# Altium footprint library connectors.PcbLib: 256 footprints (part 9 of 16)
Each footprint in its own frame and in the unit in brackets; x right, y up, seen from the top. Pads: shape width x height; smd on the part's side, far side on the other; paste and mask are expansions set on the pad; w line width, h text height; cw(c..) or ccw(c..) is an arc to the next point about the centre after c.
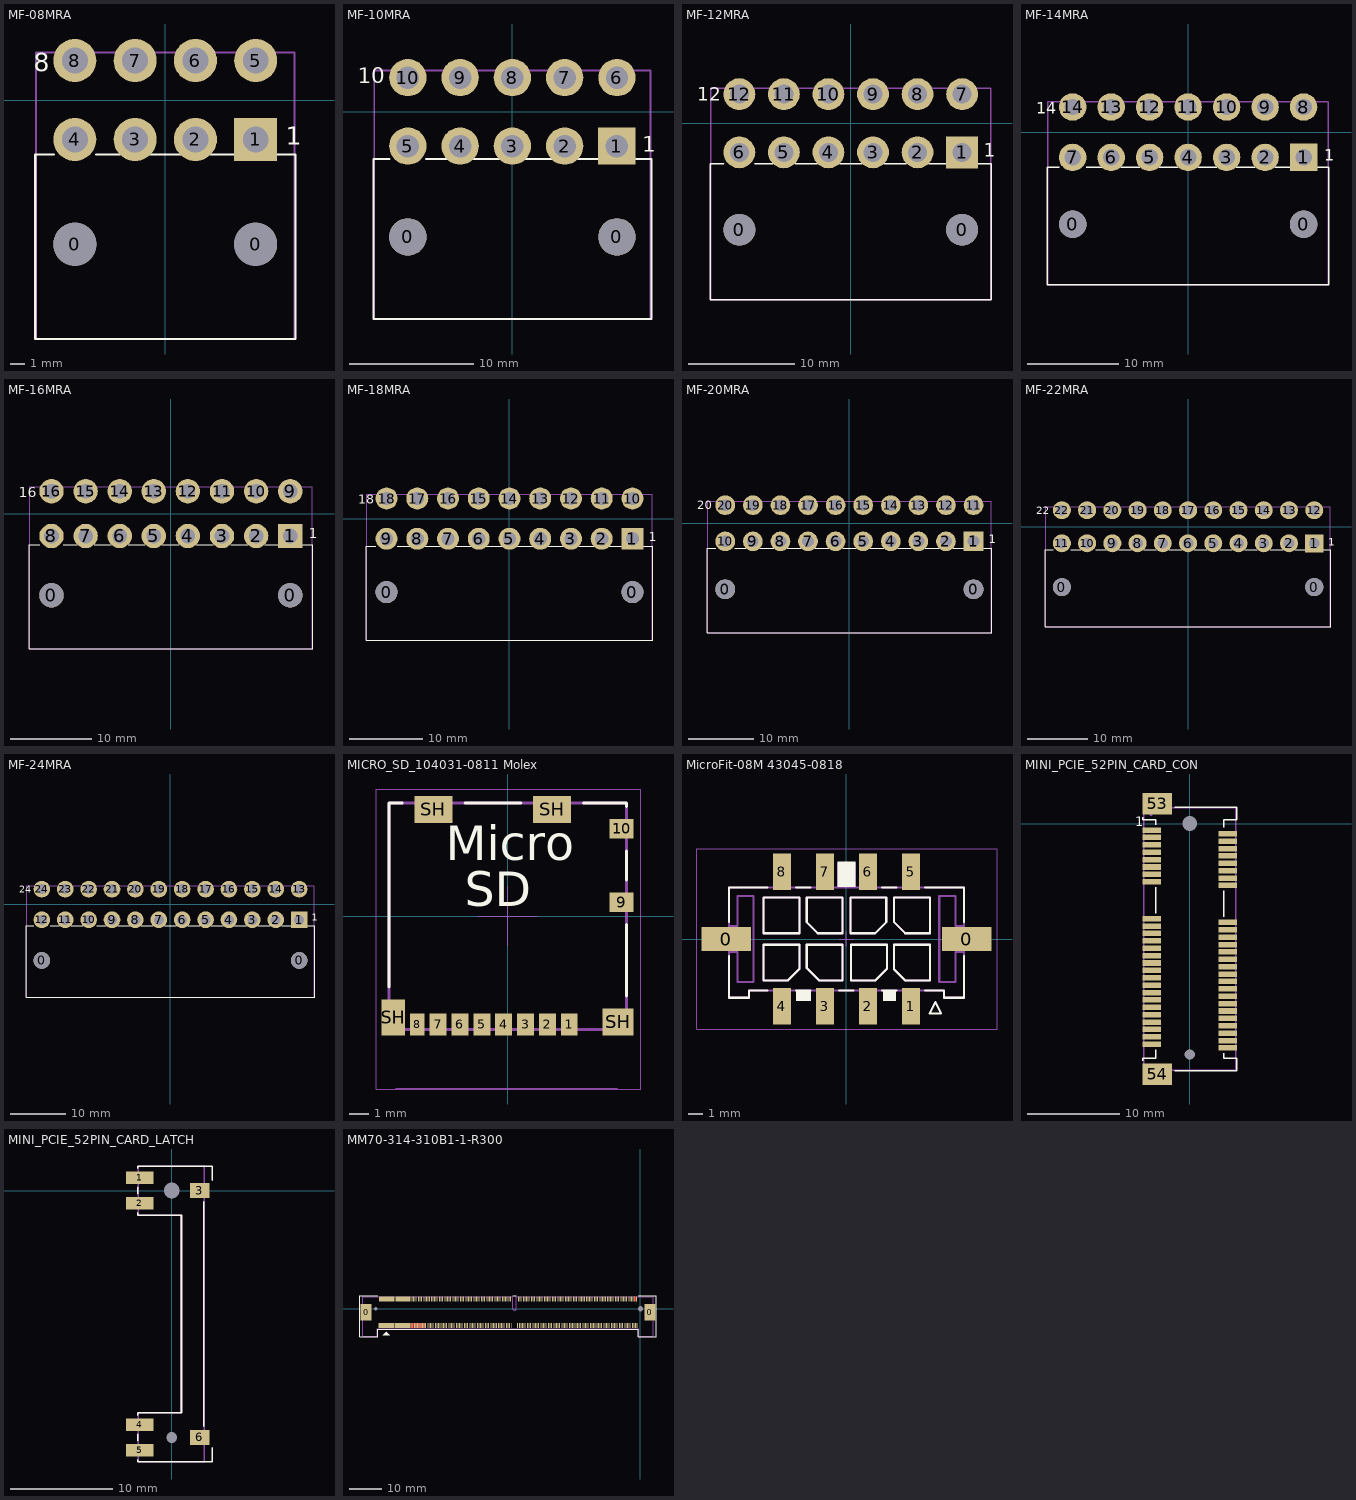
[diagram p8: the footprints below, top view; thin cyan lines are the x and y axes]

## MF-08MRA [mm] "Dual row Right angle header 08p"
height 10
pads (10):
  round 3 hole 3 unplated: 0(-6.3,-10.05) 0(6.3,-10.05)
  rect 3x3 hole 1.8: 1(6.3,-2.75)
  round 3 hole 1.8: 2(2.1,-2.75) 3(-2.1,-2.75) 4(-6.3,-2.75) 5(6.3,2.75) 6(2.1,2.75) 7(-2.1,2.75) 8(-6.3,2.75)
Top Overlay:
  lines w0.15: -9.063,-4.5 -9.063,-16.65 ; -7.77,-3.8 -9.063,-3.8 -9.063,-16.65 ; -4.83,-3.8 -3.15,-3.8 ; -1.05,-3.8 1.05,-3.8 ; 3.15,-3.8 5.25,-3.8 ; 7.35,-3.8 9.063,-3.8 9.063,-16.65 ; 9.063,-4.5 9.063,-16.65 ; -9.063,-16.65 9.063,-16.65 ; -9.063,-16.65 9.063,-16.65
  text "1" at 8.4,-3.125 h1.27
  text "8" at -9.15,2 h1.27
TopAssy 13:
  lines w0.15: -9,-16.65 -9,3.32 9,3.32 9,-16.65 -9,-16.65
3D body "64900829522.stp": height 11.36, standoff -3.59, extent -9,-16.65 9,3.32

## MF-10MRA [mm] "Dual row Right angle header 10p"
height 10
pads (12):
  round 3 hole 3 unplated: 0(-8.4,-10.05) 0(8.4,-10.05)
  rect 3x3 hole 1.8: 1(8.385,-2.75)
  round 3 hole 1.8: 2(4.2,-2.75) 3(0,-2.75) 4(-4.2,-2.75) 5(-8.4,-2.75) 6(8.4,2.75) 7(4.2,2.75) 8(0,2.75) 9(-4.2,2.75) 10(-8.4,2.75)
Top Overlay:
  lines w0.15: -11.163,-4.5 -11.163,-16.65 ; -9.87,-3.8 -11.163,-3.8 -11.163,-16.65 ; -6.93,-3.8 -5.25,-3.8 ; -3.15,-3.8 -1.05,-3.8 ; 1.05,-3.8 3.15,-3.8 ; 5.25,-3.8 7.35,-3.8 ; 9.45,-3.8 11.163,-3.8 11.163,-16.65 ; 11.163,-4.5 11.163,-16.65 ; -11.163,-16.65 11.163,-16.65 ; -11.163,-16.65 11.163,-16.65
  text "10" at -12.4,2.3 h1.27
  text "1" at 10.425,-3.2 h1.27
TopAssy 13:
  lines w0.15: -11.1,-16.65 -11.1,3.32 11.1,3.32 11.1,-16.65 -11.1,-16.65
3D body "64901029522.stp": height 11.36, standoff -3.59, extent -11.1,-16.65 11.1,3.32

## MF-12MRA [mm] "Dual row Right angle header 12p"
height 10
pads (14):
  round 3 hole 3 unplated: 0(-10.5,-10.05) 0(10.5,-10.05)
  rect 3x3 hole 1.8: 1(10.5,-2.75)
  round 3 hole 1.8: 2(6.3,-2.75) 3(2.1,-2.75) 4(-2.1,-2.75) 5(-6.3,-2.75) 6(-10.5,-2.75) 7(10.5,2.75) 8(6.3,2.75) 9(2.1,2.75) 10(-2.1,2.75) 11(-6.3,2.75) 12(-10.5,2.75)
Top Overlay:
  lines w0.15: -13.262,-4.5 -13.262,-16.65 ; -11.97,-3.8 -13.263,-3.8 -13.262,-16.65 ; -9.03,-3.8 -7.35,-3.8 ; -5.25,-3.8 -3.15,-3.8 ; -1.05,-3.8 1.05,-3.8 ; 3.15,-3.8 5.25,-3.8 ; 7.35,-3.8 9.45,-3.8 ; 11.565,-3.8 13.263,-3.8 13.263,-16.65 ; 13.263,-4.5 13.263,-16.65 ; -13.262,-16.65 13.263,-16.65 ; -13.262,-16.65 13.263,-16.65
  text "1" at 12.525,-3.15 h1.27
  text "12" at -14.5,2.1 h1.27
TopAssy 13:
  lines w0.15: -13.2,-16.65 13.2,-16.65 13.2,3.32 -13.2,3.32 -13.2,-16.65
3D body "64901229522.stp": height 11.36, standoff -3.59, extent -13.2,-16.65 13.2,3.32

## MF-14MRA [mm] "Dual row Right angle header 14p"
height 10
pads (16):
  round 3 hole 3 unplated: 0(-12.6,-10.05) 0(12.6,-10.05)
  rect 3x3 hole 1.8: 1(12.6,-2.75)
  round 3 hole 1.8: 2(8.4,-2.75) 3(4.2,-2.75) 4(0,-2.75) 5(-4.2,-2.75) 6(-8.4,-2.75) 7(-12.6,-2.75) 8(12.6,2.75) 9(8.4,2.75) 10(4.2,2.75) 11(0,2.75) 12(-4.2,2.75) 13(-8.4,2.75) 14(-12.6,2.75)
Top Overlay:
  lines w0.15: -15.363,-4.5 -15.363,-16.65 ; -14.07,-3.8 -15.363,-3.8 -15.363,-16.65 ; -11.13,-3.8 -9.45,-3.8 ; -7.35,-3.8 -5.25,-3.8 ; -3.15,-3.8 -1.05,-3.8 ; 1.05,-3.8 3.15,-3.8 ; 5.25,-3.8 7.35,-3.8 ; 9.45,-3.8 11.55,-3.8 ; 13.665,-3.8 15.363,-3.8 15.363,-16.65 ; 15.363,-4.5 15.363,-16.65 ; -15.363,-16.65 15.363,-16.65 ; -15.363,-16.65 15.363,-16.65
  text "1" at 14.875,-3.1 h1.27
  text "14" at -16.6,2 h1.27
TopAssy 13:
  lines w0.15: -15.3,-16.65 -15.3,3.32 15.3,3.32 15.3,-16.65 -15.3,-16.65
3D body "64901429522.stp": height 11.36, standoff -3.59, extent -15.3,-16.65 15.3,3.32

## MF-16MRA [mm] "Dual row Right angle header 16p"
height 10
pads (18):
  round 3 hole 3 unplated: 0(-14.7,-10.05) 0(14.7,-10.05)
  rect 3x3 hole 1.8: 1(14.7,-2.75)
  round 3 hole 1.8: 2(10.5,-2.75) 3(6.3,-2.75) 4(2.1,-2.75) 5(-2.1,-2.75) 6(-6.3,-2.75) 7(-10.5,-2.75) 8(-14.7,-2.75) 9(14.7,2.75) 10(10.5,2.75) 11(6.3,2.75) 12(2.1,2.75) 13(-2.1,2.75) 14(-6.3,2.75) 15(-10.5,2.75) 16(-14.7,2.75)
Top Overlay:
  lines w0.15: -17.462,-4.5 -17.462,-16.65 ; -16.17,-3.8 -17.463,-3.8 -17.462,-16.65 ; -13.23,-3.8 -11.55,-3.8 ; -9.45,-3.8 -7.35,-3.8 ; -5.25,-3.8 -3.15,-3.8 ; -1.05,-3.8 1.05,-3.8 ; 3.15,-3.8 5.25,-3.8 ; 7.35,-3.8 9.45,-3.8 ; 11.55,-3.8 13.65,-3.8 ; 15.765,-3.8 17.463,-3.8 17.463,-16.65 ; 17.463,-4.5 17.463,-16.65 ; -17.462,-16.65 17.463,-16.65 ; -17.462,-16.65 17.463,-16.65
  text "1" at 16.975,-3.05 h1.27
  text "16" at -18.7,2 h1.27
TopAssy 13:
  lines w0.15: -17.4,-16.65 17.4,-16.65 17.4,3.32 -17.4,3.32 -17.4,-16.65
3D body "64901629522.stp": height 11.36, standoff -3.59, extent -17.4,-16.65 17.4,3.32

## MF-18MRA [mm] "Dual row Right angle header 18p"
height 10
pads (20):
  round 3 hole 3 unplated: 0(-16.8,-10.05) 0(16.8,-10.05)
  rect 3x3 hole 1.8: 1(16.8,-2.75)
  round 3 hole 1.8: 2(12.6,-2.75) 3(8.4,-2.75) 4(4.2,-2.75) 5(0,-2.75) 6(-4.2,-2.75) 7(-8.4,-2.75) 8(-12.6,-2.75) 9(-16.8,-2.75) 10(16.8,2.75) 11(12.6,2.75) 12(8.4,2.75) 13(4.2,2.75) 14(0,2.75) 15(-4.2,2.75) 16(-8.4,2.75) 17(-12.6,2.75) 18(-16.8,2.75)
Top Overlay:
  lines w0.15: -19.562,-4.5 -19.562,-16.65 ; -18.27,-3.8 -19.563,-3.8 -19.562,-16.65 ; -15.33,-3.8 -13.65,-3.8 ; -11.55,-3.8 -9.45,-3.8 ; -7.35,-3.8 -5.25,-3.8 ; -3.15,-3.8 -1.05,-3.8 ; 1.05,-3.8 3.15,-3.8 ; 5.25,-3.8 7.35,-3.8 ; 9.45,-3.8 11.55,-3.8 ; 13.65,-3.8 15.75,-3.8 ; 17.865,-3.8 19.563,-3.8 19.563,-16.65 ; 19.563,-4.5 19.563,-16.65 ; -19.562,-16.65 19.563,-16.65 ; -19.562,-16.65 19.563,-16.65
  text "18" at -20.7,2 h1.27
  text "1" at 19.025,-3.075 h1.27
TopAssy 13:
  lines w0.15: -19.5,-16.65 -19.5,3.32 19.5,3.32 19.5,-16.65 -19.5,-16.65
3D body "64901829522.stp": height 11.36, standoff -3.59, extent -19.5,-16.65 19.5,3.32

## MF-20MRA [mm] "Dual row Right angle header 20p"
height 10
pads (22):
  round 3 hole 3 unplated: 0(-18.9,-10.05) 0(18.9,-10.05)
  rect 3x3 hole 1.8: 1(18.9,-2.75)
  round 3 hole 1.8: 2(14.7,-2.75) 3(10.5,-2.75) 4(6.3,-2.75) 5(2.1,-2.75) 6(-2.1,-2.75) 7(-6.3,-2.75) 8(-10.5,-2.75) 9(-14.7,-2.75) 10(-18.9,-2.75) 11(18.9,2.75) 12(14.7,2.75) 13(10.5,2.75) 14(6.3,2.75) 15(2.1,2.75) 16(-2.1,2.75) 17(-6.3,2.75) 18(-10.5,2.75) 19(-14.7,2.75) 20(-18.9,2.75)
Top Overlay:
  lines w0.15: -21.663,-4.5 -21.663,-16.65 ; -20.37,-3.8 -21.663,-3.8 -21.663,-16.65 ; -17.43,-3.8 -15.75,-3.8 ; -13.65,-3.8 -11.55,-3.8 ; -9.45,-3.8 -7.35,-3.8 ; -5.25,-3.8 -3.15,-3.8 ; -1.05,-3.8 1.05,-3.8 ; 3.15,-3.8 5.25,-3.8 ; 7.35,-3.8 9.45,-3.8 ; 11.55,-3.8 13.65,-3.8 ; 15.75,-3.8 17.85,-3.8 ; 19.965,-3.8 21.663,-3.8 21.663,-16.65 ; 21.663,-4.5 21.663,-16.65 ; -21.663,-16.65 21.663,-16.65 ; -21.663,-16.65 21.663,-16.65
  text "20" at -23.2,2.1 h1.27
  text "1" at 21.2,-3.075 h1.27
TopAssy 13:
  lines w0.15: -21.6,-16.65 21.6,-16.65 21.6,3.32 -21.6,3.32 -21.6,-16.65
3D body "64902029522.stp": height 11.36, standoff -3.59, extent -21.6,-16.65 21.6,3.32

## MF-22MRA [mm] "Dual row Right angle header 22p"
height 10
pads (24):
  round 3 hole 3 unplated: 0(-21,-10.05) 0(21,-10.05)
  rect 3x3 hole 1.8: 1(21,-2.75)
  round 3 hole 1.8: 2(16.8,-2.75) 3(12.6,-2.75) 4(8.4,-2.75) 5(4.2,-2.75) 6(0,-2.75) 7(-4.2,-2.75) 8(-8.4,-2.75) 9(-12.6,-2.75) 10(-16.8,-2.75) 11(-21,-2.75) 12(21,2.75) 13(16.8,2.75) 14(12.6,2.75) 15(8.4,2.75) 16(4.2,2.75) 17(0,2.75) 18(-4.2,2.75) 19(-8.4,2.75) 20(-12.6,2.75) 21(-16.8,2.75) 22(-21,2.75)
Top Overlay:
  lines w0.15: -23.763,-4.5 -23.763,-16.65 ; -22.47,-3.8 -23.763,-3.8 -23.763,-16.65 ; -19.53,-3.8 -17.85,-3.8 ; -15.33,-3.8 -13.65,-3.8 ; -11.55,-3.8 -9.45,-3.8 ; -7.35,-3.8 -5.25,-3.8 ; -3.15,-3.8 -1.05,-3.8 ; 1.05,-3.8 3.15,-3.8 ; 5.25,-3.8 7.35,-3.8 ; 9.45,-3.8 11.55,-3.8 ; 13.65,-3.8 15.75,-3.8 ; 17.85,-3.8 19.95,-3.8 ; 22.065,-3.8 23.763,-3.8 23.763,-16.65 ; 23.763,-4.5 23.763,-16.65 ; -23.763,-16.65 23.763,-16.65 ; -23.763,-16.65 23.763,-16.65
  text "1" at 23.35,-3.125 h1.27
  text "22" at -25.3,2.1 h1.27
TopAssy 13:
  lines w0.15: -23.7,-16.65 23.7,-16.65 23.7,3.32 -23.7,3.32 -23.7,-16.65
3D body "64902229522.stp": height 11.36, standoff -3.59, extent -23.7,-16.65 23.7,3.32

## MF-24MRA [mm] "Dual row Right angle header 24p"
height 10
pads (26):
  round 3 hole 3 unplated: 0(-23.1,-10.05) 0(23.1,-10.05)
  rect 3x3 hole 1.8: 1(23.1,-2.75)
  round 3 hole 1.8: 2(18.9,-2.75) 3(14.7,-2.75) 4(10.5,-2.75) 5(6.3,-2.75) 6(2.1,-2.75) 7(-2.1,-2.75) 8(-6.3,-2.75) 9(-10.5,-2.75) 10(-14.7,-2.75) 11(-18.9,-2.75) 12(-23.1,-2.75) 13(23.1,2.75) 14(18.9,2.75) 15(14.7,2.75) 16(10.5,2.75) 17(6.3,2.75) 18(2.1,2.75) 19(-2.1,2.75) 20(-6.3,2.75) 21(-10.5,2.75) 22(-14.7,2.75) 23(-18.9,2.75) 24(-23.1,2.75)
Top Overlay:
  lines w0.15: -25.863,-4.5 -25.863,-16.65 ; -24.57,-3.8 -25.863,-3.8 -25.863,-16.65 ; -21.63,-3.8 -19.95,-3.8 ; -17.85,-3.8 -15.75,-3.8 ; -13.23,-3.8 -11.55,-3.8 ; -9.45,-3.8 -7.35,-3.8 ; -5.25,-3.8 -3.15,-3.8 ; -1.05,-3.8 1.05,-3.8 ; 3.15,-3.8 5.25,-3.8 ; 7.35,-3.8 9.45,-3.8 ; 11.55,-3.8 13.65,-3.8 ; 15.75,-3.8 17.85,-3.8 ; 19.95,-3.8 22.05,-3.8 ; 24.165,-3.8 25.863,-3.8 25.863,-16.65 ; 25.863,-4.5 25.863,-16.65 ; -25.863,-16.65 25.863,-16.65 ; -25.863,-16.65 25.863,-16.65
  text "1" at 25.4,-2.925 h1.27
  text "24" at -27.2,2.1 h1.27
TopAssy 13:
  lines w0.15: -25.8,-16.65 25.8,-16.65 25.8,3.32 -25.8,3.32 -25.8,-16.65
3D body "64902429522.stp": height 11.36, standoff -3.59, extent -25.8,-16.65 25.8,3.32

## MICRO_SD_104031-0811 Molex [mm] "MICRO SD; Molex 105017-0001"
height 1.42
pads (14):
  rect 0.85x1.1 smd mask+0.05: 1(3.105,-5.45) 2(2.005,-5.45) 3(0.905,-5.45) 4(-0.195,-5.45) 5(-1.295,-5.45) 6(-2.395,-5.45) 7(-3.495,-5.45)
  rect 0.75x1.1 smd mask+0.05: 8(-4.545,-5.45)
  rect 1.2x1 smd mask+0.05: 9(5.74,0.7) 10(5.74,4.4)
  rect 1.17x1.8 smd mask+0.05: SH(-5.755,-5.1)
  rect 1.9x1.35 smd mask+0.05: SH(-3.73,5.375) SH(2.24,5.375)
  rect 1.55x1.35 smd mask+0.05: SH(5.565,-5.325)
Top Overlay:
  lines w0.15: -5.975,-3.575 -5.975,5.7 -5.3,5.7 ; -2.15,5.7 0.675,5.7 ; 3.825,5.7 5.975,5.7 5.975,5.525 ; 5.975,-4.025 5.975,-0.425 ; 5.975,1.825 5.975,3.275
  text "Micro" at -3.1,2.231 h3
  text "SD" at -2.15,-0.068 h3
Mechanical 3:
  lines w0.1: -5.625,-8.7 5.5,-8.7
  text "PCB EDGE" at 3.747,-8.782 h0.5
TopAssy 13:
  lines w0.15: -5.975,-5.7 -5.975,5.7 5.975,5.7 5.975,-5.7 -5.975,-5.7
TopCourt 15:
  lines w0.05: -1.5,0 1.5,0 ; 0,-1.5 0,1.5 ; -6.6,-8.7 -6.6,6.4 6.7,6.4 6.7,-8.7 -6.6,-8.7
3D body "1040310811.stp": height 1.46, standoff 0.01, extent -5.975,-5.7 5.975,5.7

## MICRO_SD_CARD [mm] ".Creator MM"
3D body "Micro_SD_Card.step": height 1.95, standoff 0.97, extent -8.65,-13.74 2.35,1.26

## MICRO_SIM_CARD [mm] "Creator MM"
3D body "microsim.STEP": height 1.7, standoff 0.94, extent 0,-15 12,0

## MicroFit-08M 43045-0818 [mm] "Разъем двухрядный с шагом 3мм, вилка Molex 43045-0818"
height 9.9
pads (10):
  rect 3.43x1.65 smd: 0(-8.385,0) 0(8.385,0)
  rect 1.27x2.54 smd: 1(4.5,-4.7) 2(1.5,-4.7) 3(-1.5,-4.7) 4(-4.5,-4.7) 5(4.5,4.7) 6(1.5,4.7) 7(-1.5,4.7) 8(-4.5,4.7)
Top Overlay:
  region: -0.6,3.65 -0.6,5.4 0.6,5.4 0.6,3.65
  region: -3.5,-4.3 -3.5,-3.6 -2.5,-3.6 -2.5,-4.3
  region: 2.55,-4.3 2.55,-3.6 3.45,-3.6 3.45,-4.3
  lines w0.15: -8.2,-1.2 -8.2,-4.1 -6.8,-4.1 -6.8,-3.6 -5.5,-3.6 ; -8.2,1.2 -8.2,3.6 -5.5,3.6 ; -3.5,-3.6 -2.5,-3.6 ; -3.5,3.6 -2.5,3.6 ; -0.5,-3.6 0.5,-3.6 ; 2.5,-3.6 3.5,-3.6 ; 2.5,3.6 3.5,3.6 ; 5.5,-3.6 6.8,-3.6 6.8,-4.1 8.2,-4.1 8.2,-1.2 ; 5.5,3.6 8.2,3.6 8.2,1.2 ; -5.775,-2.9 -4.1,-2.9 -3.275,-2.075 -3.275,-0.4 -5.775,-0.4 -5.775,-2.9 ; -5.775,0.4 -3.275,0.4 -3.275,2.9 -5.775,2.9 -5.775,0.4 ; -2.775,-2.025 -1.9,-2.9 -0.275,-2.9 -0.275,-0.4 -2.775,-0.4 -2.775,-2.025 ; -2.775,1.175 -2.775,2.9 -0.275,2.9 -0.275,0.4 -2,0.4 -2.775,1.175 ; 0.275,0.4 2,0.4 2.775,1.175 2.775,2.9 0.275,2.9 0.275,0.4 ; 0.325,-2.9 2,-2.9 2.825,-2.075 2.825,-0.4 0.325,-0.4 0.325,-2.9 ; 3.325,-2.125 3.325,-0.4 5.825,-0.4 5.825,-2.9 4.1,-2.9 3.325,-2.125 ; 3.325,1.175 3.325,2.9 5.825,2.9 5.825,0.4 4.1,0.4 3.325,1.175 ; 5.8,-5.2 6.6,-5.2 6.2,-4.4 5.8,-5.2
TopAssy 13:
  lines w0.15: -8.2,-0.9 -7.6,-0.9 -7.6,-3 -6.475,-3 -6.475,3 -7.6,3 -7.6,0.9 -8.2,0.9 ; -8.2,-0.6 -9.5,-0.6 -9.5,0.6 -8.2,0.6 ; -4.8,-3.6 -4.8,-5.35 -4.2,-5.35 -4.2,-3.6 ; -4.8,3.6 -4.8,5.35 -4.2,5.35 -4.2,3.6 ; -3.3,-3.6 -3.3,-4.2 -2.7,-4.2 -2.7,-3.6 ; -1.8,-3.6 -1.8,-5.35 -1.2,-5.35 -1.2,-3.6 ; -1.8,3.6 -1.8,5.35 -1.2,5.35 -1.2,3.6 ; -0.6,3.6 -0.6,5.3 0.6,5.3 0.6,3.6 ; 1.2,-3.6 1.2,-5.35 1.8,-5.35 1.8,-3.6 ; 1.2,3.6 1.2,5.35 1.8,5.35 1.8,3.6 ; 2.7,-3.6 2.7,-4.2 3.3,-4.2 3.3,-3.6 ; 4.2,-3.6 4.2,-5.35 4.8,-5.35 4.8,-3.6 ; 4.2,3.6 4.2,5.35 4.8,5.35 4.8,3.6 ; 8.2,-0.9 7.6,-0.9 7.6,-3 6.475,-3 6.475,3 7.6,3 7.6,0.9 8.2,0.9 ; 8.2,-0.6 9.5,-0.6 9.5,0.6 8.2,0.6 ; -8.2,-4.1 -8.2,3.6 8.2,3.6 8.2,-4.1 6.8,-4.1 6.8,-3.6 -6.8,-3.6 -6.8,-4.1 -8.2,-4.1 ; -5.775,-2.9 -5.775,-0.4 -3.275,-0.4 -3.275,-2.075 -4.1,-2.9 -5.775,-2.9 ; -5.775,0.4 -5.775,2.9 -3.275,2.9 -3.275,0.4 -5.775,0.4 ; -2.775,-2.025 -2.775,-0.4 -0.275,-0.4 -0.275,-2.9 -1.9,-2.9 -2.775,-2.025 ; -2.775,1.175 -2,0.4 -0.275,0.4 -0.275,2.9 -2.775,2.9 -2.775,1.175 ; 0.275,0.4 0.275,2.9 2.775,2.9 2.775,1.175 2,0.4 0.275,0.4 ; 0.325,-2.9 0.325,-0.4 2.825,-0.4 2.825,-2.075 2,-2.9 0.325,-2.9 ; 3.325,-2.125 4.1,-2.9 5.825,-2.9 5.825,-0.4 3.325,-0.4 3.325,-2.125 ; 3.325,1.175 4.1,0.4 5.825,0.4 5.825,2.9 3.325,2.9 3.325,1.175
TopCourt 15:
  lines w0.05: -0.5,0 0.5,0 ; 0,-0.5 0,0.5 ; -10.425,-6.3 10.5,-6.3 10.5,6.3 -10.425,6.3 -10.425,-6.3
3D body "430450818.stp": height 9.95, standoff -0.01, extent -9.825,-5.6 9.825,5.6

## MINI_PCIE_52PIN_CARD_CON [mm] "Creator MM"
height 5.9
pads (56):
  rect 2x0.6 smd mask+0.05: 1(-4.1,-0.7) 2(4.1,-1.1) 3(-4.1,-1.5) 4(4.1,-1.9) 5(-4.1,-2.3) 6(4.1,-2.7) 7(-4.1,-3.1) 8(4.1,-3.5) 9(-4.1,-3.9) 10(4.1,-4.3) 11(-4.1,-4.7) 12(4.1,-5.1) 13(-4.1,-5.5) 14(4.1,-5.9) 15(-4.1,-6.3) 16(4.1,-6.7) 17(-4.1,-10.3) 18(4.1,-10.7) 19(-4.1,-11.1) 20(4.1,-11.5) 21(-4.1,-11.9) 22(4.1,-12.3) 23(-4.1,-12.7) 24(4.1,-13.1) 25(-4.1,-13.5) 26(4.1,-13.9) 27(-4.1,-14.3) 28(4.1,-14.7) 29(-4.1,-15.1) 30(4.1,-15.5) 31(-4.1,-15.9) 32(4.1,-16.3) 33(-4.1,-16.7) 34(4.1,-17.1) 35(-4.1,-17.5) 36(4.1,-17.9) 37(-4.1,-18.3) 38(4.1,-18.7) 39(-4.1,-19.1) 40(4.1,-19.5) 41(-4.1,-19.9) 42(4.1,-20.3) 43(-4.1,-20.7) 44(4.1,-21.1) 45(-4.1,-21.5) 46(4.1,-21.9) 47(-4.1,-22.3) 48(4.1,-22.7) 49(-4.1,-23.1) 50(4.1,-23.5) 51(-4.1,-23.9) 52(4.1,-24.3)
  rect 3.2x2.3 smd: 53(-3.5,2.15) 54(-3.5,-27.15)
  rrect70% 0x0 hole 1.6 unplated: 55(0,0)
  rrect70% 0x0 hole 1.1 unplated: 56(0,-25)
Top Overlay:
  lines w0.15: -5.1,-25.7 -5.1,-25.4 -3.7,-25.4 -3.7,-24.5 ; -5.1,0.7 -5.1,0.4 -3.7,0.4 -3.7,-0.1 ; -3.7,-9.7 -3.7,-6.9 ; -1.6,-26.8 5.1,-26.8 5.1,-25.4 3.7,-25.4 3.7,-24.9 ; -1.6,1.8 5.1,1.8 5.1,0.4 3.7,0.4 3.7,-0.4 ; 3.7,-10.1 3.7,-7.3
  text "1" at -5.9,-0.3 h1.02
BottomCourt 16:
  circle w0.15: c-4.2,1 r0.1
  lines w0.15: -5,-26.7 -5,1.7 5,1.7 5,-26.7 -5,-26.7
Mechanical 29:
  text ".Designator" at -0.6,-10.6 h1.52
3D body "K3D-MM60-52B1-E1-R2 JAE Connector Division Proprietary.STEP": height 5.95, standoff -0.75, extent -5,-27.35 5,2.35

## MINI_PCIE_52PIN_CARD_LATCH [mm] "Creator MM"
height 6.8
pads (8):
  rect 2.7x1.2 smd mask+0.09: 1(-3.15,1.25) 2(-3.15,-1.25) 4(-3.15,-22.95) 5(-3.15,-25.45)
  rect 1.9x1.5 smd mask+0.09: 3(2.75,0) 6(2.75,-24.2)
  rrect70% 0x0 hole 1.55 mask+0.09: 7(0,0)
  rrect70% 0x0 hole 1.05 mask+0.09: 8(0,-24.2)
Top Overlay:
  lines w0.15: -3.35,-26.4 -3.35,-26.6 3.95,-26.6 3.95,-25.2 ; -3.35,-24.5 -3.35,-23.9 ; -3.35,-22 -3.35,-21.8 0.95,-21.8 0.95,-2.4 -3.35,-2.4 -3.35,-2.2 ; -3.35,-0.3 -3.35,0.3 ; -3.35,2.2 -3.35,2.4 3.95,2.4 3.95,1 ; 3.15,-23.1 3.15,-1.1
BottomCourt 16:
  lines w0.15: -3.3,-26.6 3.2,-26.6 3.2,2.4 -3.3,2.4 -3.3,-2.4 0.9,-2.4 0.9,-21.8 -3.3,-21.8 -3.3,-26.6
Mechanical 29:
  text ".Designator" at 1.5,-10.3 h1
3D body "K3D-MM60-EZH059-B5-R2 JAE Connector Division Proprietary.STEP": height 6.7, standoff -0.9, extent -3.95,-26.6 3.95,2.4

## MM70-314-310B1-1-R300 [mm]
pads (282):
  rect 3.3x5 smd: 0(-84.95,-1.1) 0(2.95,-1.1)
  round 0 hole 1.1 unplated: 0(-82,0)
  round 0 hole 1.6 unplated: 0(0,0)
  rect 0.25x1.5 smd mask+0.075: 1(-71,-5.2) 2(-70.75,3) 3(-70.5,-5.2) 4(-70.25,3) 5(-70,-5.2) 6(-69.75,3) 7(-69.5,-5.2) 8(-69.25,3) 9(-69,-5.2) 10(-68.75,3) 11(-68.5,-5.2) 12(-68.25,3) 13(-68,-5.2) 14(-67.75,3) 15(-67.5,-5.2) 16(-67.25,3) 17(-67,-5.2) 18(-66.75,3) 19(-66.5,-5.2) 20(-66.25,3) 21(-66,-5.2) 22(-65.75,3) 23(-65.5,-5.2) 24(-65.25,3) 25(-65,-5.2) 26(-64.75,3) 27(-64.5,-5.2) 28(-64.25,3) 29(-64,-5.2) 30(-63.75,3) 31(-63.5,-5.2) 32(-63.25,3) 33(-63,-5.2) 34(-62.75,3) 35(-62.5,-5.2) 36(-62.25,3) 37(-62,-5.2) 38(-61.75,3) 39(-61.5,-5.2) 40(-61.25,3) 41(-61,-5.2) 42(-60.75,3) 43(-60.5,-5.2) 44(-60.25,3) 45(-60,-5.2) 46(-59.75,3) 47(-59.5,-5.2) 48(-59.25,3) 49(-59,-5.2) 50(-58.75,3) 51(-58.5,-5.2) 52(-58.25,3) 53(-58,-5.2) 54(-57.75,3) 55(-57.5,-5.2) 56(-57.25,3) 57(-57,-5.2) 58(-56.75,3) 59(-56.5,-5.2) 60(-56.25,3) 61(-56,-5.2) 62(-55.75,3) 63(-55.5,-5.2) 64(-55.25,3) 65(-55,-5.2) 66(-54.75,3) 67(-54.5,-5.2) 68(-54.25,3) 69(-54,-5.2) 70(-53.75,3) 71(-53.5,-5.2) 72(-53.25,3) 73(-53,-5.2) 74(-52.75,3) 75(-52.5,-5.2) 76(-52.25,3) 77(-52,-5.2) 78(-51.75,3) 79(-51.5,-5.2) 80(-51.25,3) 81(-51,-5.2) 82(-50.75,3) 83(-50.5,-5.2) 84(-50.25,3) 85(-50,-5.2) 86(-49.75,3) 87(-49.5,-5.2) 88(-49.25,3) 89(-49,-5.2) 90(-48.75,3) 91(-48.5,-5.2) 92(-48.25,3) 93(-48,-5.2) 94(-47.75,3) 95(-47.5,-5.2) 96(-47.25,3) 97(-47,-5.2) 98(-46.75,3) 99(-46.5,-5.2) 100(-46.25,3) 101(-46,-5.2) 102(-45.75,3) 103(-45.5,-5.2) 104(-45.25,3) 105(-45,-5.2) 106(-44.75,3) 107(-44.5,-5.2) 108(-44.25,3) 109(-44,-5.2) 110(-43.75,3) 111(-43.5,-5.2) 112(-43.25,3) 113(-43,-5.2) 114(-42.75,3) 115(-42.5,-5.2) 116(-42.25,3) 117(-42,-5.2) 118(-41.75,3) 119(-41.5,-5.2) 120(-41.25,3) 121(-41,-5.2) 122(-40.75,3) 123(-40.5,-5.2) 124(-40.25,3) 125(-40,-5.2) 133(-38,-5.2) 134(-37.75,3) 135(-37.5,-5.2) 136(-37.25,3) 137(-37,-5.2) 138(-36.75,3) 139(-36.5,-5.2) 140(-36.25,3) 141(-36,-5.2) 142(-35.75,3) 143(-35.5,-5.2) 144(-35.25,3) 145(-35,-5.2) 146(-34.75,3) 147(-34.5,-5.2) 148(-34.25,3) 149(-34,-5.2) 150(-33.75,3) 151(-33.5,-5.2) 152(-33.25,3) 153(-33,-5.2) 154(-32.75,3) 155(-32.5,-5.2) 156(-32.25,3) 157(-32,-5.2) 158(-31.75,3) 159(-31.5,-5.2) 160(-31.25,3) 161(-31,-5.2) 162(-30.75,3) 163(-30.5,-5.2) 164(-30.25,3) 165(-30,-5.2) 166(-29.75,3) 167(-29.5,-5.2) 168(-29.25,3) 169(-29,-5.2) 170(-28.75,3) 171(-28.5,-5.2) 172(-28.25,3) 173(-28,-5.2) 174(-27.75,3) 175(-27.5,-5.2) 176(-27.25,3) 177(-27,-5.2) 178(-26.75,3) 179(-26.5,-5.2) 180(-26.25,3) 181(-26,-5.2) 182(-25.75,3) 183(-25.5,-5.2) 184(-25.25,3) 185(-25,-5.2) 186(-24.75,3) 187(-24.5,-5.2) 188(-24.25,3) 189(-24,-5.2) 190(-23.75,3) 191(-23.5,-5.2) 192(-23.25,3) 193(-23,-5.2) 194(-22.75,3) 195(-22.5,-5.2) 196(-22.25,3) 197(-22,-5.2) 198(-21.75,3) 199(-21.5,-5.2) 200(-21.25,3) 201(-21,-5.2) 202(-20.75,3) 203(-20.5,-5.2) 204(-20.25,3) 205(-20,-5.2) 206(-19.75,3) 207(-19.5,-5.2) 208(-19.25,3) 209(-19,-5.2) 210(-18.75,3) 211(-18.5,-5.2) 212(-18.25,3) 213(-18,-5.2) 214(-17.75,3) 215(-17.5,-5.2) 216(-17.25,3) 217(-17,-5.2) 218(-16.75,3) 219(-16.5,-5.2) 220(-16.25,3) 221(-16,-5.2) 222(-15.75,3) 223(-15.5,-5.2) 224(-15.25,3) 225(-15,-5.2) 226(-14.75,3) 227(-14.5,-5.2) 228(-14.25,3) 229(-14,-5.2) 230(-13.75,3) 231(-13.5,-5.2) 232(-13.25,3) 233(-13,-5.2) 234(-12.75,3) 235(-12.5,-5.2) 236(-12.25,3) 237(-12,-5.2) 238(-11.75,3) 239(-11.5,-5.2) 240(-11.25,3) 241(-11,-5.2) 242(-10.75,3) 243(-10.5,-5.2) 244(-10.25,3) 245(-10,-5.2) 246(-9.75,3) 247(-9.5,-5.2) 248(-9.25,3) 249(-9,-5.2) 250(-8.75,3) 251(-8.5,-5.2) 252(-8.25,3) 253(-8,-5.2) 254(-7.75,3) 255(-7.5,-5.2) 256(-7.25,3) 257(-7,-5.2) 258(-6.75,3) 259(-6.5,-5.2) 260(-6.25,3) 261(-6,-5.2) 262(-5.75,3) 263(-5.5,-5.2) 264(-5.25,3) 265(-5,-5.2) 266(-4.75,3) 267(-4.5,-5.2) 268(-4.25,3) 269(-4,-5.2) 270(-3.75,3) 271(-3.5,-5.2) 272(-3.25,3) 273(-3,-5.2) 274(-2.75,3) 275(-2.5,-5.2) 276(-2.25,3) 277(-2,-5.2) 278(-1.75,3) 279(-1.5,-5.2) 280(-1.25,3) 281(-1,-5.2)
  rect 4.75x1.5 smd mask+0.075: E1(-78.75,-5.2) E2(-78.5,3) E3(-73.75,-5.2) E4(-73.5,3)
Top Layer:
  region: -1.9,3.75 -1.1,3.75 -1.1,2.25 -1.9,2.25
  region: -68.65,-4.45 -66.85,-4.45 -66.85,-5.95 -68.65,-5.95
  region: -71.15,-4.45 -68.85,-4.45 -68.85,-5.95 -71.15,-5.95
Top Overlay:
  region: -78.7,-7.1 -79.8,-8.2 -77.6,-8.2
  lines w0.15: -81.4,4 -86.9,4 -86.9,-8.65 -81.4,-8.65 -81.4,-6.3 -0.6,-6.3 -0.6,-8.65 4.9,-8.65 4.9,4 -0.6,4 ; -39.6,4 -38.4,4
TopAssy 13:
  lines w0.15: -85.95,-8.475 -81.5,-8.475 -81.5,-6.2 -0.5,-6.2 -0.5,-8.475 3.95,-8.475 3.95,3.725 -38.4,3.725 -38.4,0.125 cw(c-39,0.125) -39.6,0.125 -39.6,3.75 -85.95,3.75 -85.95,-8.475
3D body "K3D-MM70-314-310B1-V2_JAE_Proprietary.STEP": height 6.7, standoff -1, extent -85.95,-8.475 3.95,3.725